# Altium footprint library Basal.PcbLib: 248 footprints (part 8 of 16)
Each footprint in its own frame and in the unit in brackets; x right, y up, seen from the top. Pads: shape width x height; smd on the part's side, far side on the other; paste and mask are expansions set on the pad; w line width, h text height; cw(c..) or ccw(c..) is an arc to the next point about the centre after c.
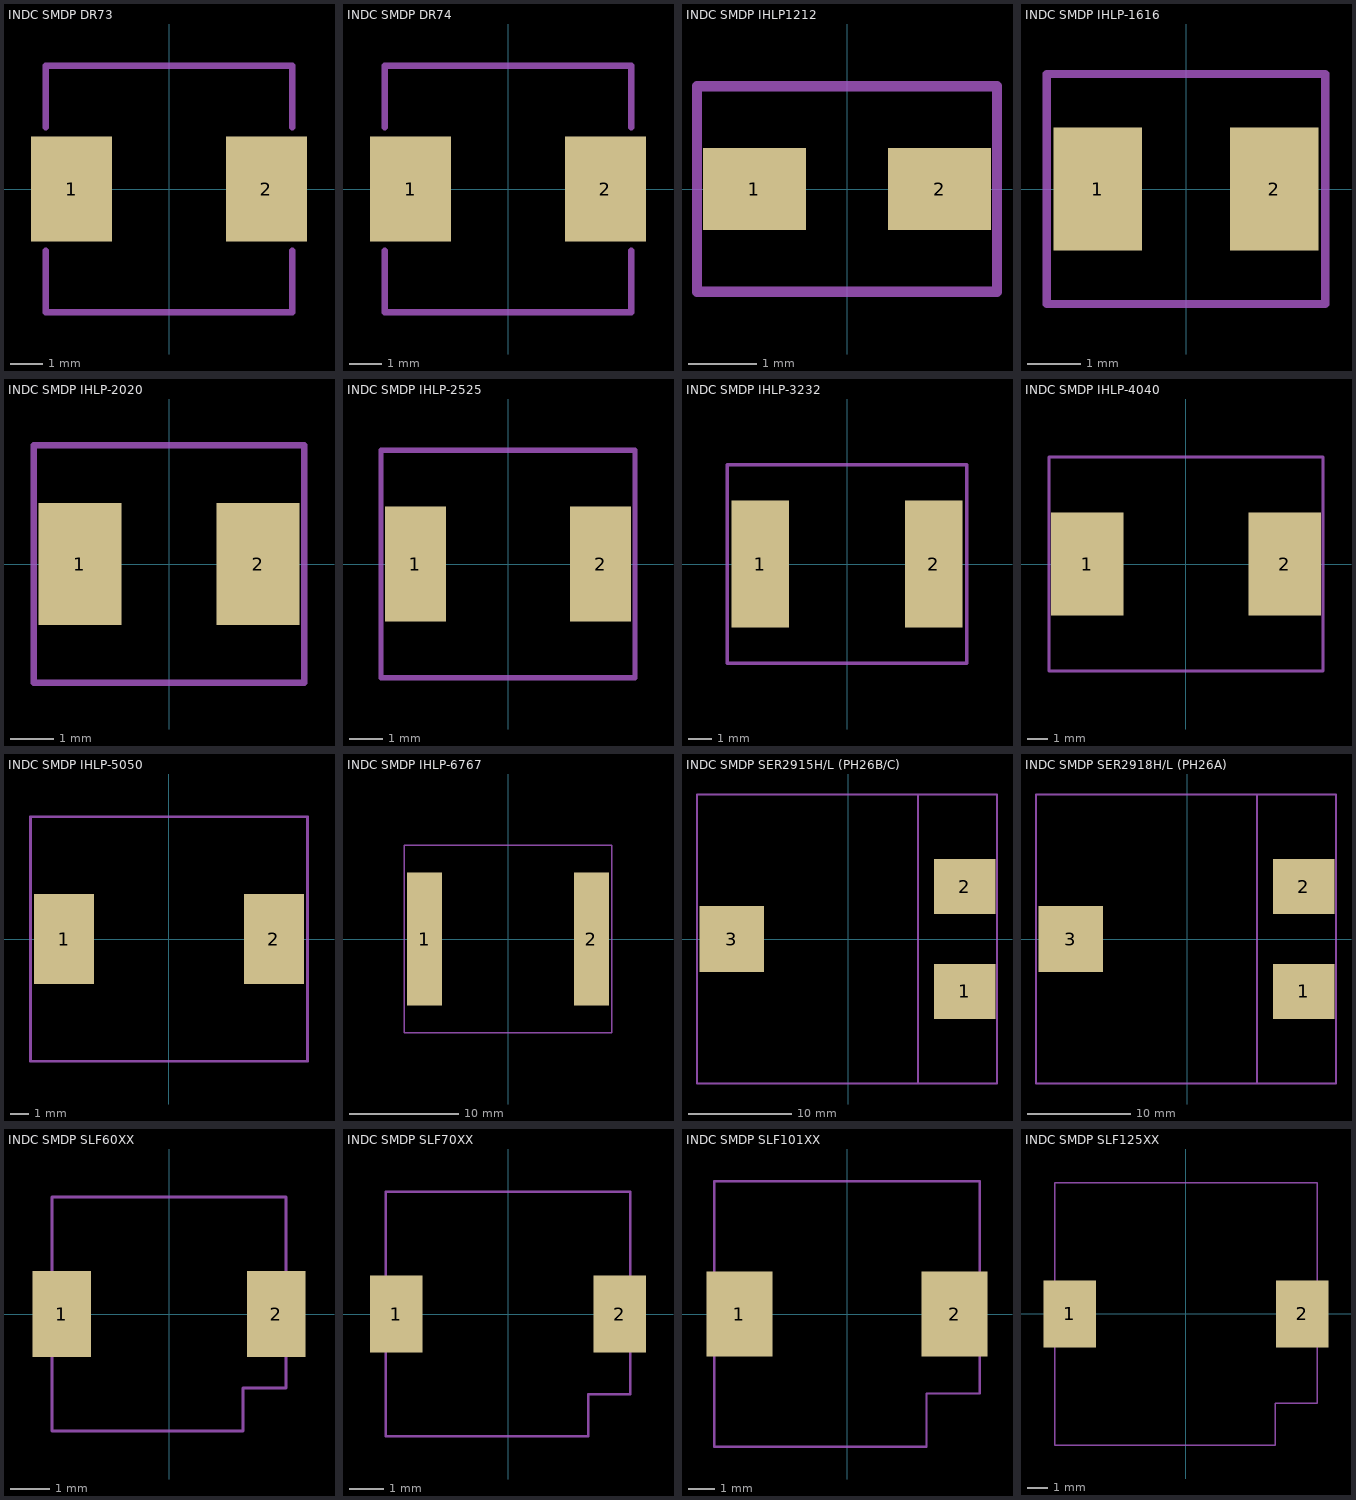
[diagram p7: the footprints below, top view; thin cyan lines are the x and y axes]

## INDC SMDP DR73 [mm] "TDK贴片功率电感"
pads (2):
  rect 2.5x3.25 smd: 1(-3,0) 2(3,0)
Mechanical 15:
  lines w0.203: -3.8,-1.9 -3.8,-3.8 3.8,-3.8 3.8,-1.9 ; -3.8,1.9 -3.8,3.8 3.8,3.8 3.8,1.9
3D body "DR73.STEP": height 3.55, standoff 0, extent -3.8,-3.8 3.8,3.8

## INDC SMDP DR74 [mm] "TDK贴片功率电感"
pads (2):
  rect 2.5x3.25 smd: 1(-3,0) 2(3,0)
Mechanical 15:
  lines w0.203: -3.8,-1.9 -3.8,-3.8 3.8,-3.8 3.8,-1.9 ; -3.8,1.9 -3.8,3.8 3.8,3.8 3.8,1.9
3D body "DR74.STEP": height 4.35, standoff 0, extent -3.8,-3.8 3.8,3.8

## INDC SMDP IHLP1212 [mm] "VISHAY大电流电感IHLP1212"
pads (2):
  rect 1.5x1.2 smd: 1(-1.35,0) 2(1.35,0)
Mechanical 15:
  lines w0.152: -2.184,-1.499 2.184,-1.499 2.184,1.499 -2.184,1.499 -2.184,-1.499
3D body "IHLP1212.STEP": height 2.01, standoff -0.03, extent -1.829,-1.499 1.829,1.499

## INDC SMDP IHLP-1616 [mm] "VISHAY大电流电感IHLP1616"
pads (2):
  rect 1.65x2.3 smd: 1(-1.651,0) 2(1.651,0)
Mechanical 15:
  lines w0.152: -2.6,-2.15 -2.6,2.15 2.6,2.15 2.6,-2.15 -2.6,-2.15
3D body "IHLP-1616BZ-01.STEP": height 2, standoff 0, extent -2.2,-2.055 2.25,2.005

## INDC SMDP IHLP-2020 [mm] "VISHAY大电流电感IHLP2020"
pads (2):
  rect 1.9x2.79 smd: 1(-2.04,0) 2(2.04,0)
Mechanical 15:
  lines w0.152: -3.1,-2.72 3.1,-2.72 3.1,2.72 -3.1,2.72 -3.1,-2.72
3D body "IHLP-2020BZ-01.STEP": height 2, standoff 0, extent -2.694,-2.59 2.796,2.59

## INDC SMDP IHLP-2525 [mm] "VISHAY大电流电感IHLP2525"
pads (2):
  rect 1.83x3.43 smd: 1(-2.77,0) 2(2.77,0)
Mechanical 15:
  lines w0.152: -3.8,-3.4 -3.8,3.4 3.8,3.4 3.8,-3.4 -3.8,-3.4
3D body "IHLP-2525CZ.STEP": height 3, standoff 0, extent -3.468,-3.235 3.392,3.235

## INDC SMDP IHLP-3232 [mm] "VISHAY大电流电感IHLP3232"
pads (2):
  rect 2.41x5.3 smd: 1(-3.62,0) 2(3.62,0)
Mechanical 15:
  lines w0.152: -5,-4.15 -5,4.15 5,4.15 5,-4.15 -5,-4.15
3D body: height 4, standoff 0, extent -4.343,-3.937 4.343,3.988

## INDC SMDP IHLP-4040 [mm] "VISHAY大电流电感IHLP4040"
pads (2):
  rect 3.5x4.95 smd: 1(-4.75,0) 2(4.75,0)
Mechanical 15:
  lines w0.152: -6.6,-5.15 6.6,-5.15 6.6,5.15 -6.6,5.15 -6.6,-5.15
3D body "IHLP-4040DZ-01.STEP": height 4, standoff 0, extent -5.409,-5.201 5.511,5.099

## INDC SMDP IHLP-5050 [mm] "VISHAY大电流电感IHLP5050"
pads (2):
  rect 3.3x4.95 smd: 1(-5.753,0) 2(5.753,0)
Mechanical 15:
  lines w0.152: -7.6,-6.7 7.6,-6.7 7.6,6.7 -7.6,6.7 -7.6,-6.7
3D body "IHLP-5050FD-01.STEP": height 6.3, standoff 0, extent -6.7,-6.45 6.7,6.45

## INDC SMDP IHLP-6767 [mm] "VISHAY大电流电感IHLP6767"
pads (2):
  rect 3.2x12.19 smd: 1(-7.648,0) 2(7.648,0)
Mechanical 15:
  lines w0.152: -9.5,-8.6 -9.5,8.6 9.5,8.6 9.5,-8.6 -9.5,-8.6
3D body "6767DZ IHLP PART.STEP": height 6.98, standoff -0.03, extent -8.699,-8.573 8.7,8.572

## INDC SMDP SER2915H/L (PH26B/C) [mm] "SER2915H/L"
height 15.36
pads (3):
  rect 6x5.33 smd: 1(11.288,-5.075) 2(11.288,5.075)
  rect 6.28x6.35 smd: 3(-11.287,0)
Mechanical 15:
  lines w0.203: 6.764,-14 6.764,14 ; -14.648,-14 14.409,-14 14.409,14 -14.648,14 -14.648,-14
3D body "Coilcraft-SER2915L.STEP": height 15.4, standoff 0.04, extent -14.643,-13.945 13.298,13.957

## INDC SMDP SER2918H/L (PH26A) [mm] "SER2915H/L"
height 15.36
pads (3):
  rect 6x5.33 smd: 1(11.288,-5.075) 2(11.288,5.075)
  rect 6.28x6.35 smd: 3(-11.287,0)
Mechanical 15:
  lines w0.203: 6.764,-14 6.764,14 ; -14.648,-14 -14.648,14 14.409,14 14.409,-14 -14.648,-14
3D body "Coilcraft-SER2918.STEP": height 17.33, standoff 0.13, extent -14.027,-13.5 12.681,13.5

## INDC SMDP SLF60XX [mm] "TDK贴片功率电感"
pads (2):
  rect 1.5x2.2 smd: 1(-2.75,0) 2(2.75,0)
Mechanical 15:
  lines w0.076: -3,-3 1.9,-3 1.9,-1.9 3,-1.9 3,3 -3,3 -3,-3
3D body "TDK - SLF6045.STEP": height 4.5, standoff 0, extent -3,-3 3,3

## INDC SMDP SLF70XX [mm] "TDK贴片功率电感"
pads (2):
  rect 1.5x2.2 smd: 1(-3.2,0) 2(3.2,0)
Mechanical 15:
  lines w0.076: -3.5,-3.5 -3.5,3.5 3.5,3.5 3.5,-2.3 2.3,-2.3 2.3,-3.5 -3.5,-3.5
3D body "tdk_slf7045.STEP": height 4.51, standoff -0.1, extent -3.6,-3.5 3.6,3.5

## INDC SMDP SLF101XX [mm] "TDK贴片功率电感"
pads (2):
  rect 2.5x3.2 smd: 1(-4.05,0) 2(4.05,0)
Mechanical 15:
  lines w0.076: -5,-5 -5,5 5,5 5,-3 3,-3 3,-5 -5,-5
3D body "TDK SLF10145.STEP": height 4.5, standoff 0, extent -5.06,-5.05 5.06,5.05

## INDC SMDP SLF125XX [mm]
pads (2):
  rect 2.5x3.2 smd: 1(-5.55,0) 2(5.55,0)
Mechanical 15:
  lines w0.076: -6.25,-6.25 -6.25,6.25 6.25,6.25 6.25,-4.25 4.25,-4.25 4.25,-6.25 -6.25,-6.25
3D body "TDK SLF12575T.STEP": height 8.35, standoff 0, extent -6.385,-6.25 6.385,6.25